# Altium footprint library 晶体管封装库.PcbLib: 101 footprints (part 7 of 7)
Each footprint in its own frame and in the unit in brackets; x right, y up, seen from the top. Pads: shape width x height; smd on the part's side, far side on the other; paste and mask are expansions set on the pad; w line width, h text height; cw(c..) or ccw(c..) is an arc to the next point about the centre after c.
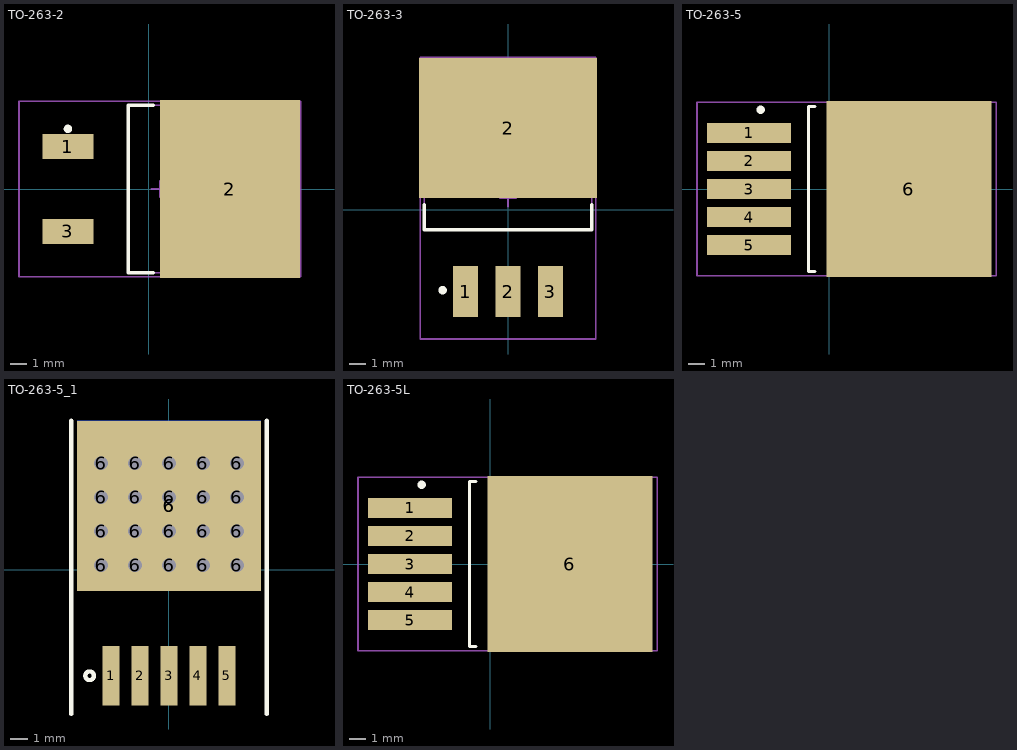
[diagram p6: the footprints below, top view; thin cyan lines are the x and y axes]

## TO-263-2 [mm]
pads (3):
  rect 3.05x1.5 smd: 1(-4.845,2.54) 3(-4.845,-2.54)
  rect 8.38x10.66 smd: 2(4.845,0)
Top Overlay:
  circle w0.25: c-4.845,3.598 r0.125
  lines w0.2: 0.255,-5 -1.245,-5 -1.245,5 0.255,5
Mechanical 13:
  lines w0.1: -1.245,-5 7.411,-5 7.411,5 -1.245,5 -1.245,-5
Mechanical 15:
  lines w0.1: 0.155,0 1.155,0 ; 0.655,-0.5 0.655,0.5 ; -7.77,-5.25 9.08,-5.25 9.08,5.25 -7.77,5.25 -7.77,-5.25
3D body: height 1.4, standoff 1, extent 7.411,-4.039 8.58,4.039
3D body: height 1.4, standoff 1, extent -3.155,-0.483 -1.428,0.279
3D body: height 1.4, standoff 1, extent -1.441,-0.635 -1.22,0.381
3D body: height 1.4, standoff 1, extent -4.181,2.159 -1.453,2.921
3D body: height 0.4, standoff 0, extent -4.943,2.159 -4.181,2.921
3D body: height 1.4, standoff 0, extent -4.181,2.159 -4.054,2.921
3D body: height 1.4, standoff 1, extent -1.466,2.007 -1.245,3.023
3D body: height 1.4, standoff 1, extent -1.466,-3.073 -1.245,-2.057
3D body: height 1.4, standoff 0, extent -4.181,-2.921 -4.054,-2.159
3D body: height 0.4, standoff 0, extent -4.943,-2.921 -4.181,-2.159
3D body: height 1.4, standoff 1, extent -4.181,-2.921 -1.453,-2.159
3D body: height 4.7, standoff 0.6, extent -1.245,-5 7.411,5

## TO-263-3 [mm]
pads (4):
  rect 1.5x3.05 smd: 1(-2.54,-4.894) 2(0,-4.894) 3(2.54,-4.894)
  rect 10.66x8.38 smd: 2(0,4.894)
Top Overlay:
  circle w0.25: c-3.91,-4.801 r0.125
  lines w0.2: -5,0.304 -5,-1.196 5,-1.196 5,0.304
Mechanical 13:
  lines w0.1: -5,-1.196 -5,7.461 5,7.461 5,-1.196 -5,-1.196
Mechanical 15:
  lines w0.1: -0.5,0.704 0.5,0.704 ; 0,0.204 0,1.204 ; -5.25,-7.721 -5.25,9.129 5.25,9.129 5.25,-7.721 -5.25,-7.721
3D body: height 1.4, standoff 1, extent -4.039,7.461 4.039,8.629
3D body: height 1.4, standoff 1, extent -2.921,-4.132 -2.159,-1.404
3D body: height 0.4, standoff 0, extent -2.921,-4.894 -2.159,-4.132
3D body: height 1.4, standoff 0, extent -2.921,-4.132 -2.159,-4.005
3D body: height 1.4, standoff 1, extent -3.023,-1.417 -2.007,-1.196
3D body: height 1.4, standoff 1, extent 2.057,-1.417 3.073,-1.196
3D body: height 1.4, standoff 0, extent 2.159,-4.132 2.921,-4.005
3D body: height 0.4, standoff 0, extent 2.159,-4.894 2.921,-4.132
3D body: height 1.4, standoff 1, extent 2.159,-4.132 2.921,-1.404
3D body: height 4.7, standoff 0.6, extent -5,-1.196 5,7.461
3D body: height 1.4, standoff 1, extent -0.381,-4.132 0.381,-1.404
3D body: height 0.4, standoff 0, extent -0.381,-4.894 0.381,-4.132
3D body: height 1.4, standoff 0, extent -0.381,-4.132 0.381,-4.005
3D body: height 1.4, standoff 1, extent -0.483,-1.417 0.533,-1.196

## TO-263-5 [mm]
pads (6):
  rect 5.08x1.2 smd: 1(-4.845,3.4) 2(-4.845,1.7) 3(-4.845,0) 4(-4.845,-1.7) 5(-4.845,-3.4)
  rect 10x10.66 smd: 6(4.845,0)
Top Overlay:
  circle w0.25: c-4.138,4.801 r0.125
  lines w0.2: -0.864,-5 -1.245,-5 -1.245,5 -0.864,5
Mechanical 15:
  lines w0.1: 0.155,0 1.155,0 ; 0.655,-0.5 0.655,0.5 ; -7.995,-5.25 10.129,-5.25 10.129,5.25 -7.995,5.25 -7.995,-5.25
3D body: height 4.58, standoff 0.02, extent -4.34,-5.055 9.674,5.105

## TO-263-5_1 [mm]
height 5
pads (27):
  rect 1x3.5 smd: 1(-3.4,-6.25) 2(-1.7,-6.25) 3(0,-6.25) 4(1.7,-6.25) 5(3.4,-6.25)
  round 1.5 hole 0.8: 6(-4,0.25) 6(-4,2.25) 6(-4,4.25) 6(-4,6.25) 6(-2,0.25) 6(-2,2.25) 6(-2,4.25) 6(-2,6.25) 6(0,0.25) 6(0,2.25) 6(0,4.25) 6(0,6.25) 6(2,0.25) 6(2,2.25) 6(2,4.25) 6(2,6.25) 6(4,0.25) 6(4,2.25) 6(4,4.25) 6(4,6.25)
  rect 10.8x10 smd: 6(0,3.75)
  rect 10.8x10 smd far side: 6(0,3.75)
Top Overlay:
  circle w0.254: c-4.67,-6.25 r0.254
  lines w0.254: -5.75,-8.5 -5.75,8.75 ; 5.75,-8.5 5.75,8.75
3D body: height 4.56, standoff 0, extent -5.08,-6.5 5.08,7.515

## TO-263-5L [mm]
pads (6):
  rect 5.08x1.2 smd: 1(-4.845,3.4) 2(-4.845,1.7) 3(-4.845,0) 4(-4.845,-1.7) 5(-4.845,-3.4)
  rect 10x10.66 smd: 6(4.845,0)
Top Overlay:
  circle w0.25: c-4.138,4.801 r0.125
  lines w0.2: -0.864,-5 -1.245,-5 -1.245,5 -0.864,5
Mechanical 15:
  lines w0.1: 0.155,0 1.155,0 ; 0.655,-0.5 0.655,0.5 ; -7.995,-5.25 10.129,-5.25 10.129,5.25 -7.995,5.25 -7.995,-5.25
3D body: height 4.58, standoff 0.02, extent -4.34,-5.055 9.674,5.105